# Altium footprint library 3.10-RJ11 、RJ45、VGA接口.PcbLib: 21 footprints (part 2 of 2)
Each footprint in its own frame and in the unit in brackets; x right, y up, seen from the top. Pads: shape width x height; smd on the part's side, far side on the other; paste and mask are expansions set on the pad; w line width, h text height; cw(c..) or ccw(c..) is an arc to the next point about the centre after c.
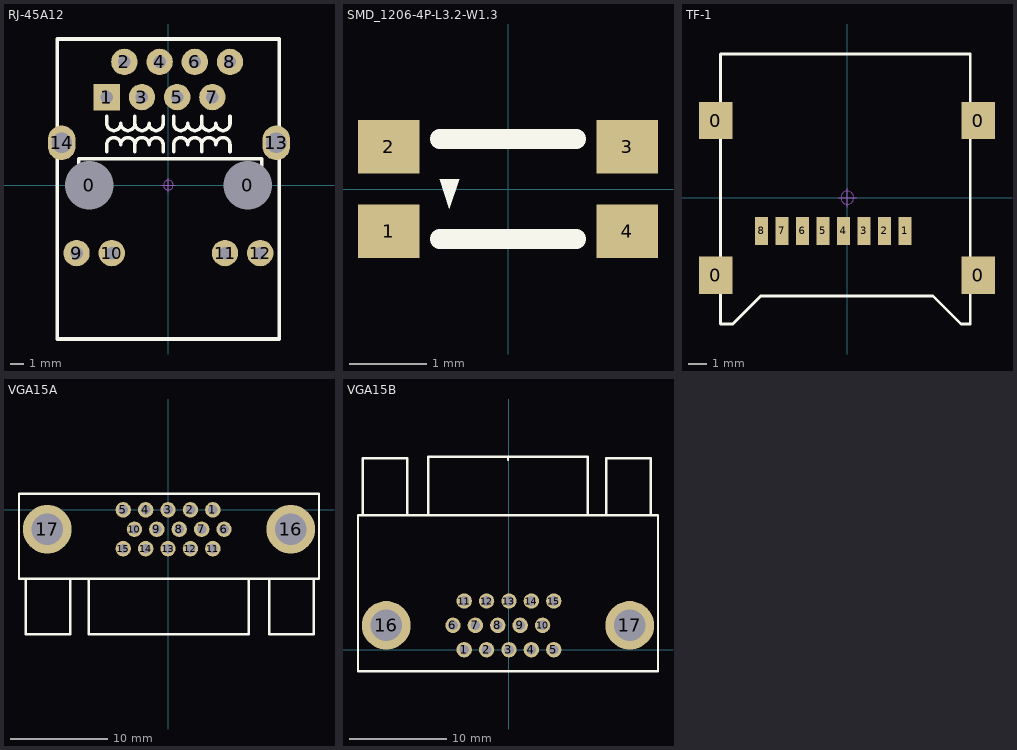
[diagram p1: the footprints below, top view; thin cyan lines are the x and y axes]

## RJ-45A12 [mm] "网线接口"
pads (16):
  round 3.302 hole 3.5: 0(-5.715,0) 0(5.715,0)
  rect 1.905x1.905 hole 0.9: 1(-4.445,6.35)
  round 1.905 hole 0.9: 2(-3.175,8.89) 3(-1.905,6.35) 4(-0.635,8.89) 5(0.635,6.35) 6(1.905,8.89) 7(3.175,6.35) 8(4.445,8.89) 9(-6.625,-4.9) 10(-4.085,-4.9) 11(4.085,-4.9) 12(6.625,-4.9)
  oval 2x2.5 hole 1.5: 13(7.785,3.05) 14(-7.695,3.05)
Top Overlay:
  lines w0.254: -6.477,1.397 -6.477,1.905 6.731,1.905 6.731,1.397 ; -4.445,2.413 -4.445,2.921 cw(c-3.937,2.921) -3.429,2.921 cw(c-2.921,2.921) -2.413,2.921 ; -4.445,4.953 -4.445,4.445 ccw(c-3.937,4.445) -3.429,4.445 ccw(c-2.921,4.445) -2.413,4.445 ; -2.413,2.413 -2.413,2.921 ; -2.413,4.953 -2.413,4.445 ; -0.381,2.413 -0.381,2.921 ccw(c-0.889,2.921) -1.397,2.921 ccw(c-1.905,2.921) -2.413,2.921 ; -0.381,4.953 -0.381,4.445 cw(c-0.889,4.445) -1.397,4.445 cw(c-1.905,4.445) -2.413,4.445 ; 0.381,2.413 0.381,2.921 cw(c0.889,2.921) 1.397,2.921 cw(c1.905,2.921) 2.413,2.921 ; 0.381,4.953 0.381,4.445 ccw(c0.889,4.445) 1.397,4.445 ccw(c1.905,4.445) 2.413,4.445 ; 2.413,2.413 2.413,2.921 ; 2.413,4.953 2.413,4.445 ; 4.445,2.413 4.445,2.921 ccw(c3.937,2.921) 3.429,2.921 ccw(c2.921,2.921) 2.413,2.921 ; 4.445,4.953 4.445,4.445 cw(c3.937,4.445) 3.429,4.445 cw(c2.921,4.445) 2.413,4.445 ; -8.001,-11.1 -8.001,10.541 8.001,10.541 8.001,-11.1 -8.001,-11.1
Mechanical 15:
  circle w0.05: c0,0 r0.35
  lines w0.05: -0.5,0 0.5,0 ; 0,-0.5 0,0.5
3D body "HanRun-HR911105A.STEP": height 1.5, standoff -15, extent -7.971,-10.926 7.909,10.474

## SMD_1206-4P-L3.2-W1.3 [mm]
pads (4):
  rect 0.8x0.7 smd: 1(-1.55,-0.55) 2(-1.55,0.55) 3(1.55,0.55) 4(1.55,-0.55)
Top Overlay:
  region: -0.889,0.127 -0.635,0.127 -0.762,-0.254
  lines w0.254: -0.889,-0.65 0.889,-0.65 ; -0.889,0.65 0.889,0.65
3D body: height 0.76, standoff 0, extent -1.143,-0.635 1.143,0.635

## TF-1 [mm]
height 2
pads (12):
  rect 1.8x2 smd: 0(-7.068,-4.16) 0(-7.068,4.14) 0(7.032,-4.16) 0(7.032,4.14)
  rect 0.7x1.5 smd: 1(3.1,-1.783) 2(2,-1.783) 3(0.9,-1.783) 4(-0.2,-1.783) 5(-1.3,-1.783) 6(-2.4,-1.783) 7(-3.5,-1.783) 8(-4.6,-1.783)
Top Overlay:
  lines w0.152: -6.8,-6.783 -6.15,-6.783 -4.65,-5.283 4.6,-5.283 6.1,-6.783 6.6,-6.783 6.6,7.717 3.1,7.717 -6.8,7.717 -6.8,-6.783
Mechanical 15:
  circle w0.05: c0,0 r0.35
  lines w0.05: -0.5,0 0.5,0 ; 0,-0.5 0,0.5
3D body "User Library-5009010801.STEP": height 1.93, standoff -0.02, extent -7.4,-6.783 7.2,7.717

## VGA15A [mm] "15针通讯接口"
pads (17):
  round 1.58 hole 1: 1(4.6,0) 2(2.3,0) 3(0,0) 4(-2.3,0) 5(-4.6,0) 6(5.75,-1.992) 7(3.45,-1.992) 8(1.15,-1.992) 9(-1.15,-1.992) 10(-3.45,-1.992) 11(4.6,-3.984) 12(2.3,-3.984) 13(0,-3.984) 14(-2.3,-3.984) 15(-4.6,-3.984)
  round 5 hole 3.25: 16(12.6,-1.992) 17(-12.4,-1.992)
Top Overlay:
  lines w0.254: -14.605,-7.087 -14.605,-12.751 -10.025,-12.751 -10.025,-7.087 ; -8.125,-7.061 -8.125,-12.751 8.275,-12.751 8.275,-7.137 ; 10.405,-7.061 10.405,-12.751 14.975,-12.751 14.975,-7.061 ; -15.3,-7.061 -15.3,1.629 15.5,1.629 15.5,-7.061 -15.3,-7.061
Mechanical 15:
  circle w0.05: c0,0 r0.35
  lines w0.05: -0.5,0 0.5,0 ; 0,-0.5 0,0.5
3D body "User Library-SLIM D-SUB RIGHT ANGLE PCB MOUNT.step": height 10.75, standoff -2.59, extent -15.397,-12.395 15.403,1.075

## VGA15B [mm] "15针通讯接口"
pads (17):
  round 1.58 hole 1: 1(-4.6,0) 2(-2.3,0) 3(0,0) 4(2.3,0) 5(4.6,0) 6(-5.75,2.5) 7(-3.45,2.5) 8(-1.15,2.5) 9(1.15,2.5) 10(3.45,2.5) 11(-4.6,5) 12(-2.3,5) 13(0,5) 14(2.3,5) 15(4.6,5)
  round 5 hole 3.25: 16(-12.6,2.5) 17(12.4,2.5)
Top Overlay:
  lines w0.254: -15.5,-2.2 -15.5,13.8 15.3,13.8 15.3,-2.2 -15.49,-2.2 -15.5,-2.19 ; -15,13.8 -15,19.67 -10.43,19.67 -10.43,13.82 ; -8.3,13.8 -8.3,19.8 8.1,19.8 8.1,13.8 ; -0.1,19.5 -0.1,19.8 ; 10,13.8 10,19.68 14.58,19.68 14.58,13.84
Mechanical 15:
  circle w0.05: c0,0 r0.35
  lines w0.05: -0.5,0 0.5,0 ; 0,-0.5 0,0.5
3D body "SW3dPS-Connector, D-Sub, 15 pin HD, RA, Receptacle.STEP": height 12.77, standoff -3.27, extent -15.655,-0.875 15.155,20.225